# Altium footprint library ERNI THD.PcbLib: 27 footprints (part 1 of 3)
Each footprint in its own frame and in the unit in brackets; x right, y up, seen from the top. Pads: shape width x height; smd on the part's side, far side on the other; paste and mask are expansions set on the pad; w line width, h text height; cw(c..) or ccw(c..) is an arc to the next point about the centre after c.
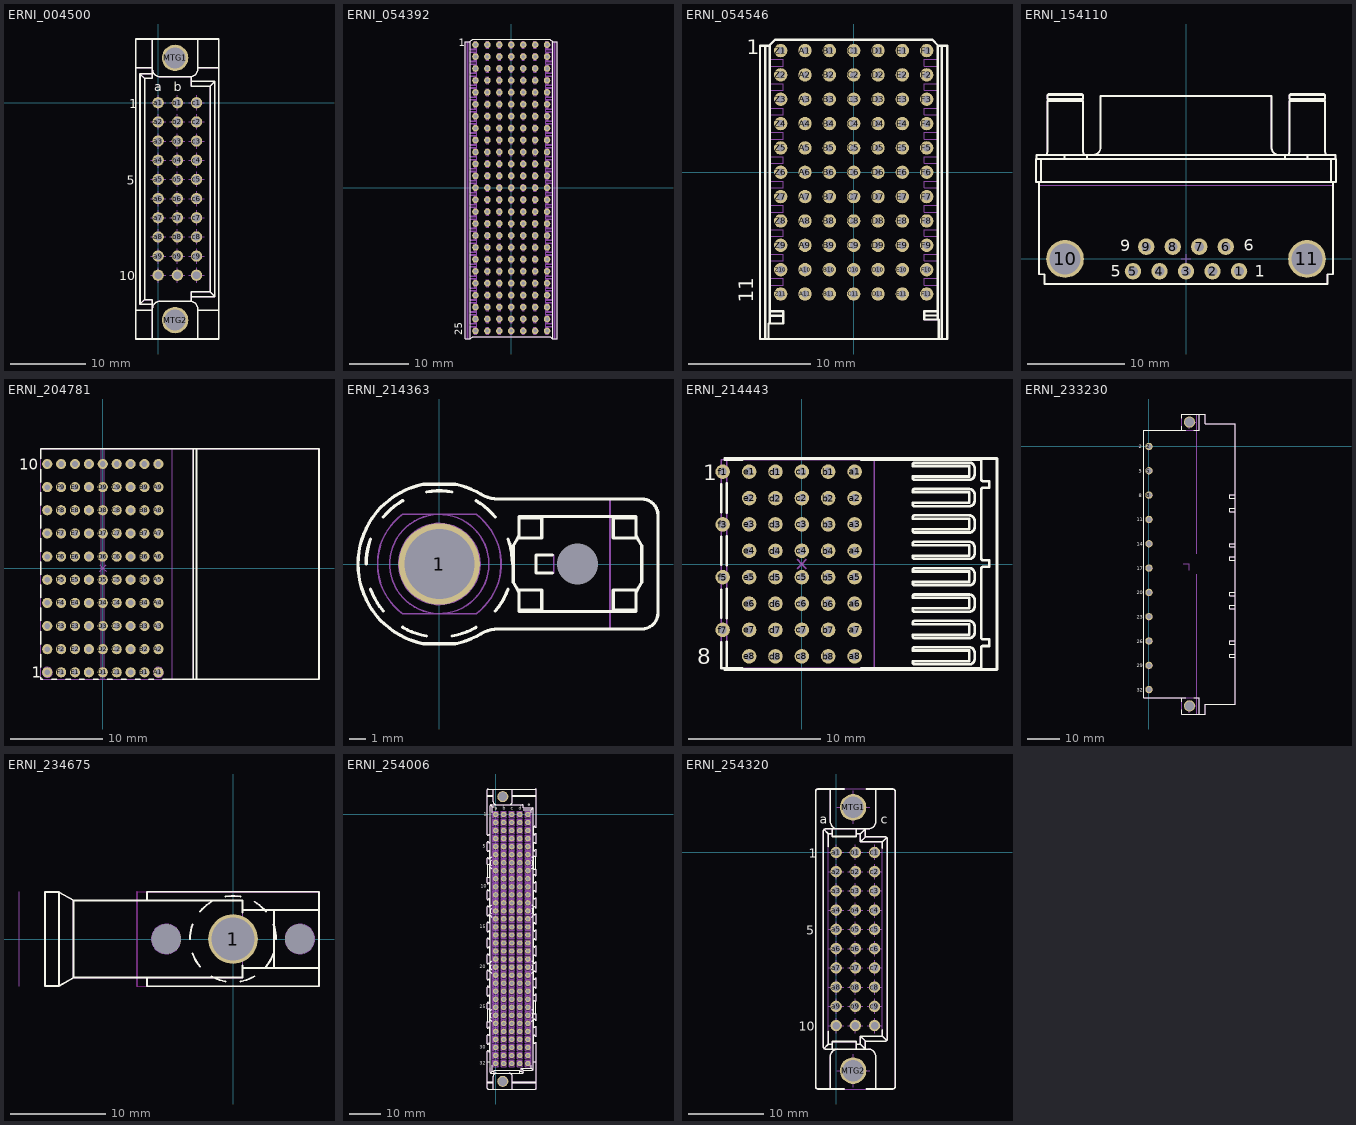
[diagram p0: the footprints below, top view; thin cyan lines are the x and y axes]

## ERNI_004500 [mm] "Connector; DIN 41612, Type R/3, Thru-Hole; Rows a+b+c, 30 Male Contacts"
height 11.5
pads (32):
  round 1.5 hole 1: a1(0,0) a2(0,-2.54) a3(0,-5.08) a4(0,-7.62) a5(0,-10.16) a6(0,-12.7) a7(0,-15.24) a8(0,-17.78) a9(0,-20.32) a10(0,-22.86) b1(2.54,0) b2(2.54,-2.54) b3(2.54,-5.08) b4(2.54,-7.62) b5(2.54,-10.16) b6(2.54,-12.7) b7(2.54,-15.24) b8(2.54,-17.78) b9(2.54,-20.32) b10(2.54,-22.86) c1(5.08,0) c2(5.08,-2.54) c3(5.08,-5.08) c4(5.08,-7.62) c5(5.08,-10.16) c6(5.08,-12.7) c7(5.08,-15.24) c8(5.08,-17.78) c9(5.08,-20.32) c10(5.08,-22.86)
  round 3.5 / inner round 3.5 / far side round 5.1 hole 2.8: MTG1(2.24,5.95) MTG2(2.24,-28.81)
Top Overlay:
  lines w0.2: -2.96,-27.479 -0.76,-27.479 ; -2.96,4.619 -0.76,4.619 ; -0.76,-31.309 -0.76,-27.479 ; -0.76,-26.679 -2.41,-26.679 ; -0.76,3.819 -2.41,3.819 ; -0.76,8.449 -0.76,4.619 ; 4.39,-26.314 4.39,-25.079 6.89,-25.079 ; 4.39,-25.679 4.99,-25.679 7.49,-25.679 ; 4.39,2.819 4.99,2.819 7.49,2.819 ; 4.39,3.454 4.39,2.219 6.89,2.219 ; 5.24,-31.309 5.24,-27.309 ccw(c4.24,-27.309) 4.24,-26.309 0.24,-26.309 ccw(c0.24,-27.309) -0.76,-27.309 ; 5.24,-27.479 8.04,-27.479 ; 5.24,4.619 8.04,4.619 ; 5.24,8.449 5.24,4.449 cw(c4.24,4.449) 4.24,3.449 0.24,3.449 cw(c0.24,4.449) -0.76,4.449 ; -2.41,-26.679 -1.81,-26.079 ; -2.41,-26.679 -2.41,3.819 ; -2.41,3.819 -1.81,3.219 ; -1.81,-26.079 -0.76,-26.079 -0.76,-27.309 ; -1.81,-26.079 -1.81,3.219 ; -1.81,3.219 -0.76,3.219 -0.76,4.449 ; -0.76,-27.479 -0.76,-27.309 ; -0.76,4.449 -0.76,4.619 ; 6.89,-25.079 6.89,2.219 ; 6.89,-25.079 7.49,-25.679 ; 6.89,2.219 7.49,2.819 ; 7.49,-25.679 7.49,2.819 ; -2.96,-31.309 -2.96,8.449 8.04,8.449 8.04,-31.309 -2.96,-31.309
  text "b" at 2.032,1.524 h1.2
  text "a" at -0.508,1.524 h1.2
  text "5" at -4.174,-10.885 h1.2
  text "10" at -5.172,-23.535 h1.2
  text "1" at -3.839,-0.725 h1.2
Mechanical 8:
  lines w0.1: -1,-22.86 0,-22.86 ; -1,-20.32 0,-20.32 ; -1,-17.78 0,-17.78 ; -1,-15.24 0,-15.24 ; -1,-12.7 0,-12.7 ; -1,-10.16 0,-10.16 ; -1,-7.62 0,-7.62 ; -1,-5.08 0,-5.08 ; -1,-2.54 0,-2.54 ; -1,0 0,0 ; 0,-23.86 0,-22.86 ; 0,-21.86 0,-22.86 ; 0,-21.32 0,-20.32 ; 0,-19.32 0,-20.32 ; 0,-18.78 0,-17.78 ; 0,-16.78 0,-17.78 ; 0,-16.24 0,-15.24 ; 0,-14.24 0,-15.24 ; 0,-13.7 0,-12.7 ; 0,-11.7 0,-12.7 ; 0,-11.16 0,-10.16 ; 0,-9.16 0,-10.16 ; 0,-8.62 0,-7.62 ; 0,-6.62 0,-7.62 ; 0,-6.08 0,-5.08 ; 0,-4.08 0,-5.08 ; 0,-3.54 0,-2.54 ; 0,-1.54 0,-2.54 ; 0,-1 0,0 ; 0,1 0,0 ; 1,-22.86 0,-22.86 ; 1,-20.32 0,-20.32 ; 1,-17.78 0,-17.78 ; 1,-15.24 0,-15.24 ; 1,-12.7 0,-12.7 ; 1,-10.16 0,-10.16 ; 1,-7.62 0,-7.62 ; 1,-5.08 0,-5.08 ; 1,-2.54 0,-2.54 ; 1,0 0,0 ; 1.24,-28.81 2.24,-28.81 ; 1.24,5.95 2.24,5.95 ; 1.54,-22.86 2.54,-22.86 ; 1.54,-20.32 2.54,-20.32 ; 1.54,-17.78 2.54,-17.78 ; 1.54,-15.24 2.54,-15.24 ; 1.54,-12.7 2.54,-12.7 ; 1.54,-10.16 2.54,-10.16 ; 1.54,-7.62 2.54,-7.62 ; 1.54,-5.08 2.54,-5.08 ; 1.54,-2.54 2.54,-2.54 ; 1.54,0 2.54,0 ; 2.24,-29.81 2.24,-28.81 ; 2.24,-27.81 2.24,-28.81 ; 2.24,4.95 2.24,5.95 ; 2.24,6.95 2.24,5.95 ; 2.54,-23.86 2.54,-22.86 ; 2.54,-21.86 2.54,-22.86 ; 2.54,-21.32 2.54,-20.32 ; 2.54,-19.32 2.54,-20.32 ; 2.54,-18.78 2.54,-17.78 ; 2.54,-16.78 2.54,-17.78 ; 2.54,-16.24 2.54,-15.24 ; 2.54,-14.24 2.54,-15.24 ; 2.54,-13.7 2.54,-12.7 ; 2.54,-11.7 2.54,-12.7 ; 2.54,-11.16 2.54,-10.16 ; 2.54,-9.16 2.54,-10.16 ; 2.54,-8.62 2.54,-7.62 ; 2.54,-6.62 2.54,-7.62 ; 2.54,-6.08 2.54,-5.08 ; 2.54,-4.08 2.54,-5.08 ; 2.54,-3.54 2.54,-2.54 ; 2.54,-1.54 2.54,-2.54 ; 2.54,-1 2.54,0 ; 2.54,1 2.54,0 ; 3.24,-28.81 2.24,-28.81 ; 3.24,5.95 2.24,5.95 ; 3.54,-22.86 2.54,-22.86 ; 3.54,-20.32 2.54,-20.32 ; 3.54,-17.78 2.54,-17.78 ; 3.54,-15.24 2.54,-15.24 ; 3.54,-12.7 2.54,-12.7 ; 3.54,-10.16 2.54,-10.16 ; 3.54,-7.62 2.54,-7.62 ; 3.54,-5.08 2.54,-5.08 ; 3.54,-2.54 2.54,-2.54 ; 3.54,0 2.54,0 ; 4.08,-22.86 5.08,-22.86 ; 4.08,-20.32 5.08,-20.32 ; 4.08,-17.78 5.08,-17.78 ; 4.08,-15.24 5.08,-15.24 ; 4.08,-12.7 5.08,-12.7 ; 4.08,-10.16 5.08,-10.16 ; 4.08,-7.64 5.08,-7.64 ; 4.08,-5.08 5.08,-5.08 ; 4.08,-2.54 5.08,-2.54 ; 4.08,0 5.08,0 ; 5.08,-23.86 5.08,-22.86 ; 5.08,-21.86 5.08,-22.86 ; 5.08,-21.32 5.08,-20.32 ; 5.08,-19.32 5.08,-20.32 ; 5.08,-18.78 5.08,-17.78 ; 5.08,-16.78 5.08,-17.78 ; 5.08,-16.24 5.08,-15.24 ; 5.08,-14.24 5.08,-15.24 ; 5.08,-13.7 5.08,-12.7 ; 5.08,-11.7 5.08,-12.7 ; 5.08,-11.16 5.08,-10.16 ; 5.08,-9.16 5.08,-10.16 ; 5.08,-8.64 5.08,-7.64 ; 5.08,-6.64 5.08,-7.64 ; 5.08,-6.08 5.08,-5.08 ; 5.08,-4.08 5.08,-5.08 ; 5.08,-3.54 5.08,-2.54 ; 5.08,-1.54 5.08,-2.54 ; 5.08,-1 5.08,0 ; 5.08,1 5.08,0 ; 6.08,-22.86 5.08,-22.86 ; 6.08,-20.32 5.08,-20.32 ; 6.08,-17.78 5.08,-17.78 ; 6.08,-15.24 5.08,-15.24 ; 6.08,-12.7 5.08,-12.7 ; 6.08,-10.16 5.08,-10.16 ; 6.08,-7.64 5.08,-7.64 ; 6.08,-5.08 5.08,-5.08 ; 6.08,-2.54 5.08,-2.54 ; 6.08,0 5.08,0
Mechanical 14:
  circle w0.1: c2.24,5.949 r1.4
  circle w0.1: c2.24,-28.809 r1.4
  lines w0.1: -2.96,-27.479 -0.76,-27.479 ; -2.96,4.619 -0.76,4.619 ; -0.76,-31.309 -0.76,-27.479 ; -0.76,-26.679 -2.41,-26.679 ; -0.76,3.819 -2.41,3.819 ; -0.76,8.449 -0.76,4.619 ; 4.39,-26.314 4.39,-25.079 6.89,-25.079 ; 4.39,-25.679 4.99,-25.679 7.49,-25.679 ; 4.39,2.819 4.99,2.819 7.49,2.819 ; 4.39,3.454 4.39,2.219 6.89,2.219 ; 5.24,-31.309 5.24,-27.309 ccw(c4.24,-27.309) 4.24,-26.309 0.24,-26.309 ccw(c0.24,-27.309) -0.76,-27.309 ; 5.24,-27.479 8.04,-27.479 ; 5.24,4.619 8.04,4.619 ; 5.24,8.449 5.24,4.449 cw(c4.24,4.449) 4.24,3.449 0.24,3.449 cw(c0.24,4.449) -0.76,4.449 ; -2.41,-26.679 -1.81,-26.079 ; -2.41,-26.679 -2.41,3.819 ; -2.41,3.819 -1.81,3.219 ; -1.81,-26.079 -0.76,-26.079 -0.76,-27.309 ; -1.81,-26.079 -1.81,3.219 ; -1.81,3.219 -0.76,3.219 -0.76,4.449 ; -0.76,-27.479 -0.76,-27.309 ; -0.76,4.449 -0.76,4.619 ; 6.89,-25.079 6.89,2.219 ; 6.89,-25.079 7.49,-25.679 ; 6.89,2.219 7.49,2.819 ; 7.49,-25.679 7.49,2.819 ; -2.96,-31.309 -2.96,8.449 8.04,8.449 8.04,-31.309 -2.96,-31.309
  text "b" at 2.032,1.524 h1.2
  text "a" at -0.508,1.524 h1.2
  text "10" at -5.172,-23.535 h1.2
  text "1" at -3.839,-0.725 h1.2
  text "5" at -4.174,-10.885 h1.2
3D body "ERNI_004500.stp": height 11.6, standoff -4.5, extent -2.96,-31.308 8.04,8.449

## ERNI_054392 [mm] "125 Signal Contact in 5 Rows + 50 Ground Shield in 2 Rows, (175 Contacts in 7 Rows z,a,b,c,d,e,f of 25 positions), Pitch 2 mm,  Press-Fit, Vertical Ermet Hard Metric Male Connector"
height 13.45
pads (175):
  round 1.1 hole 0.6: A1(-4,24) A2(-4,22) A3(-4,20) A4(-4,18) A5(-4,16) A6(-4,14) A7(-4,12) A8(-4,10) A9(-4,8) A10(-4,6) A11(-4,4) A12(-4,2) A13(-4,0) A14(-4,-2) A15(-4,-4) A16(-4,-6) A17(-4,-8) A18(-4,-10) A19(-4,-12) A20(-4,-14) A21(-4,-16) A22(-4,-18) A23(-4,-20) A24(-4,-22) A25(-4,-24) B1(-2,24) B2(-2,22) B3(-2,20) B4(-2,18) B5(-2,16) B6(-2,14) B7(-2,12) B8(-2,10) B9(-2,8) B10(-2,6) B11(-2,4) B12(-2,2) B13(-2,0) B14(-2,-2) B15(-2,-4) B16(-2,-6) B17(-2,-8) B18(-2,-10) B19(-2,-12) B20(-2,-14) B21(-2,-16) B22(-2,-18) B23(-2,-20) B24(-2,-22) B25(-2,-24) C1(0,24) C2(0,22) C3(0,20) C4(0,18) C5(0,16) C6(0,14) C7(0,12) C8(0,10) C9(0,8) C10(0,6) C11(0,4) C12(0,2) C13(0,0) C14(0,-2) C15(0,-4) C16(0,-6) C17(0,-8) C18(0,-10) C19(0,-12) C20(0,-14) C21(0,-16) C22(0,-18) C23(0,-20) C24(0,-22) C25(0,-24) D1(2,24) D2(2,22) D3(2,20) D4(2,18) D5(2,16) D6(2,14) D7(2,12) D8(2,10) D9(2,8) D10(2,6) D11(2,4) D12(2,2) D13(2,0) D14(2,-2) D15(2,-4) D16(2,-6) D17(2,-8) D18(2,-10) D19(2,-12) D20(2,-14) D21(2,-16) D22(2,-18) D23(2,-20) D24(2,-22) D25(2,-24) E1(4,24) E2(4,22) E3(4,20) E4(4,18) E5(4,16) E6(4,14) E7(4,12) E8(4,10) E9(4,8) E10(4,6) E11(4,4) E12(4,2) E13(4,0) E14(4,-2) E15(4,-4) E16(4,-6) E17(4,-8) E18(4,-10) E19(4,-12) E20(4,-14) E21(4,-16) E22(4,-18) E23(4,-20) E24(4,-22) E25(4,-24) F1(6,24) F2(6,22) F3(6,20) F4(6,18) F5(6,16) F6(6,14) F7(6,12) F8(6,10) F9(6,8) F10(6,6) F11(6,4) F12(6,2) F13(6,0) F14(6,-2) F15(6,-4) F16(6,-6) F17(6,-8) F18(6,-10) F19(6,-12) F20(6,-14) F21(6,-16) F22(6,-18) F23(6,-20) F24(6,-22) F25(6,-24) Z1(-6,24) Z2(-6,22) Z3(-6,20) Z4(-6,18) Z5(-6,16) Z6(-6,14) Z7(-6,12) Z8(-6,10) Z9(-6,8) Z10(-6,6) Z11(-6,4) Z12(-6,2) Z13(-6,0) Z14(-6,-2) Z15(-6,-4) Z16(-6,-6) Z17(-6,-8) Z18(-6,-10) Z19(-6,-12) Z20(-6,-14) Z21(-6,-16) Z22(-6,-18) Z23(-6,-20) Z24(-6,-22) Z25(-6,-24)
Top Overlay:
  lines w0.2: -6.9,24.5 -6.9,-25.35 ; 6.9,24.5 6.9,-25.35 ; 7.7,3 7.7,24.45 ; -6.9,-25.35 -6.5,-24.95 6.5,-24.95 6.9,-25.35 ; -6.9,-25.35 -7.7,-25.35 -7.7,24.45 -6.95,24.45 -6.45,24.95 6.45,24.95 6.95,24.45 7.7,24.45 ; 6.9,-25.35 7.7,-25.35 7.7,24.45
  text "25" at -8.25,-24.725 h1.2
  text "1" at -8.8,23.7 h1.2
Mechanical 8:
  lines w0.1: -6.5,-24 -6,-24 ; -6.5,-22 -6,-22 ; -6.5,22 -6,22 ; -6.5,24 -6,24 ; -6,-24.5 -6,-24 ; -6,-23.5 -6,-24 ; -6,-22.5 -6,-22 ; -6,-21.5 -6,-22 ; -6,21.5 -6,22 ; -6,22.5 -6,22 ; -6,23.5 -6,24 ; -6,24.5 -6,24 ; -5.5,-24 -6,-24 ; -5.5,-22 -6,-22 ; -5.5,22 -6,22 ; -5.5,24 -6,24 ; -4.5,-24 -4,-24 ; -4.5,-22 -4,-22 ; -4.5,22 -4,22 ; -4.5,24 -4,24 ; -4,-24.5 -4,-24 ; -4,-23.5 -4,-24 ; -4,-22.5 -4,-22 ; -4,-21.5 -4,-22 ; -4,21.5 -4,22 ; -4,22.5 -4,22 ; -4,23.5 -4,24 ; -4,24.5 -4,24 ; -3.5,-24 -4,-24 ; -3.5,-22 -4,-22 ; -3.5,22 -4,22 ; -3.5,24 -4,24 ; -2.5,-24 -2,-24 ; -2.5,-22 -2,-22 ; -2.5,22 -2,22 ; -2.5,24 -2,24 ; -2,-24.5 -2,-24 ; -2,-23.5 -2,-24 ; -2,-22.5 -2,-22 ; -2,-21.5 -2,-22 ; -2,21.5 -2,22 ; -2,22.5 -2,22 ; -2,23.5 -2,24 ; -2,24.5 -2,24 ; -1.5,-24 -2,-24 ; -1.5,-22 -2,-22 ; -1.5,22 -2,22 ; -1.5,24 -2,24 ; -0.5,-24 0,-24 ; -0.5,-22 0,-22 ; -0.5,0 0,0 ; -0.5,22 0,22 ; -0.5,24 0,24 ; 0,-24.5 0,-24 ; 0,-23.5 0,-24 ; 0,-22.5 0,-22 ; 0,-21.5 0,-22 ; 0,-0.5 0,0 ; 0,0.5 0,0 ; 0,21.5 0,22 ; 0,22.5 0,22 ; 0,23.5 0,24 ; 0,24.5 0,24 ; 0.5,-24 0,-24 ; 0.5,-22 0,-22 ; 0.5,0 0,0 ; 0.5,22 0,22 ; 0.5,24 0,24 ; 1.5,-24 2,-24 ; 1.5,-22 2,-22 ; 1.5,22 2,22 ; 1.5,24 2,24 ; 2,-24.5 2,-24 ; 2,-23.5 2,-24 ; 2,-22.5 2,-22 ; 2,-21.5 2,-22 ; 2,21.5 2,22 ; 2,22.5 2,22 ; 2,23.5 2,24 ; 2,24.5 2,24 ; 2.5,-24 2,-24 ; 2.5,-22 2,-22 ; 2.5,22 2,22 ; 2.5,24 2,24 ; 3.5,-24 4,-24 ; 3.5,-22 4,-22 ; 3.5,22 4,22 ; 3.5,24 4,24 ; 4,-24.5 4,-24 ; 4,-23.5 4,-24 ; 4,-22.5 4,-22 ; 4,-21.5 4,-22 ; 4,21.5 4,22 ; 4,22.5 4,22 ; 4,23.5 4,24 ; 4,24.5 4,24 ; 4.5,-24 4,-24 ; 4.5,-22 4,-22 ; 4.5,22 4,22 ; 4.5,24 4,24 ; 5.5,-24 6,-24 ; 5.5,-22 6,-22 ; 5.5,22 6,22 ; 5.5,24 6,24 ; 6,-24.5 6,-24 ; 6,-23.5 6,-24 ; 6,-22.5 6,-22 ; 6,-21.5 6,-22 ; 6,21.5 6,22 ; 6,22.5 6,22 ; 6,23.5 6,24 ; 6,24.5 6,24 ; 6.5,-24 6,-24 ; 6.5,-22 6,-22 ; 6.5,22 6,22 ; 6.5,24 6,24
Mechanical 14:
  drawing of 1008 lines, arcs and shapes, not listed
  text "25" at -8.25,-24.725 h1.2
  text "a" at -4.5,25.425 h1.2
  text "z" at -6.525,25.45 h1.2
  text "b" at -2.527,25.345 h1.2
  text "c" at -0.479,25.345 h1.2
  text "d" at 1.552,25.345 h1.2
  text "e" at 3.525,25.37 h1.2
  text "f" at 5.521,25.327 h1.2
  text "1" at -8.8,23.7 h1.2
Drill Drawing:
  lines w0.1: -6.9,-24.95 6.9,-24.95 6.9,24.95 -6.9,24.95 -6.9,-24.95
  text "PRESS-FIT TECHNOLOGY diam. 0.6mm +/-0.05" at 8.25,-18.9 h1
3D body "ERNI_054392.stp": height 13.45, standoff -3.7, extent -7.7,-25.35 7.7,24.95

## ERNI_054546 [mm] "55 Signal Contact in 5 Rows + 22 Ground Shield in 2 Rows, (77 Contacts in 7 Rows z,a,b,c,d,e,f of 11 positions), Pitch 2 mm,  Press-Fit, Vertical Ermet Hard Metric Type C Male Connector"
height 13.45
pads (77):
  round 1.1 hole 0.6: A1(-4,10) A2(-4,8) A3(-4,6) A4(-4,4) A5(-4,2) A6(-4,0) A7(-4,-2) A8(-4,-4) A9(-4,-6) A10(-4,-8) A11(-4,-10) B1(-2,10) B2(-2,8) B3(-2,6) B4(-2,4) B5(-2,2) B6(-2,0) B7(-2,-2) B8(-2,-4) B9(-2,-6) B10(-2,-8) B11(-2,-10) C1(0,10) C2(0,8) C3(0,6) C4(0,4) C5(0,2) C6(0,0) C7(0,-2) C8(0,-4) C9(0,-6) C10(0,-8) C11(0,-10) D1(2,10) D2(2,8) D3(2,6) D4(2,4) D5(2,2) D6(2,0) D7(2,-2) D8(2,-4) D9(2,-6) D10(2,-8) D11(2,-10) E1(4,10) E2(4,8) E3(4,6) E4(4,4) E5(4,2) E6(4,0) E7(4,-2) E8(4,-4) E9(4,-6) E10(4,-8) E11(4,-10) F1(6,10) F2(6,8) F3(6,6) F4(6,4) F5(6,2) F6(6,0) F7(6,-2) F8(6,-4) F9(6,-6) F10(6,-8) F11(6,-10) Z1(-6,10) Z2(-6,8) Z3(-6,6) Z4(-6,4) Z5(-6,2) Z6(-6,0) Z7(-6,-2) Z8(-6,-4) Z9(-6,-6) Z10(-6,-8) Z11(-6,-10)
Top Overlay:
  lines w0.2: -7.25,-13.7 -7.25,10.398 ; -7,-13.7 -7,-12.425 -5.8,-12.425 -5.8,-11.425 -6.9,-11.425 ; -6.95,10.398 -6.45,10.898 6.45,10.898 6.95,10.398 ; -6.9,-12.425 -6.9,10.398 -7.7,10.398 -7.7,-13.7 7.7,-13.7 7.7,10.398 6.9,10.398 6.9,-12.1 ; -6.9,-11.775 -5.8,-11.775 ; 5.8,-11.763 6.9,-11.775 ; 6.9,-11.425 5.8,-11.425 5.8,-12.1 7,-12.1 7,-13.7 ; 7.25,-13.7 7.25,10.398
  text "1" at -8.8,9.7 h1.2
  text "11" at -8.25,-10.725 h1.2
Mechanical 8:
  lines w0.1: -6.5,-10 -6,-10 ; -6.5,-8 -6,-8 ; -6.5,8 -6,8 ; -6.5,10 -6,10 ; -6,-10.5 -6,-10 ; -6,-9.5 -6,-10 ; -6,-8.5 -6,-8 ; -6,-7.5 -6,-8 ; -6,7.5 -6,8 ; -6,8.5 -6,8 ; -6,9.5 -6,10 ; -6,10.5 -6,10 ; -5.5,-10 -6,-10 ; -5.5,-8 -6,-8 ; -5.5,8 -6,8 ; -5.5,10 -6,10 ; -4.5,-10 -4,-10 ; -4.5,-8 -4,-8 ; -4.5,8 -4,8 ; -4.5,10 -4,10 ; -4,-10.5 -4,-10 ; -4,-9.5 -4,-10 ; -4,-8.5 -4,-8 ; -4,-7.5 -4,-8 ; -4,7.5 -4,8 ; -4,8.5 -4,8 ; -4,9.5 -4,10 ; -4,10.5 -4,10 ; -3.5,-10 -4,-10 ; -3.5,-8 -4,-8 ; -3.5,8 -4,8 ; -3.5,10 -4,10 ; -2.5,-10 -2,-10 ; -2.5,-8 -2,-8 ; -2.5,8 -2,8 ; -2.5,10 -2,10 ; -2,-10.5 -2,-10 ; -2,-9.5 -2,-10 ; -2,-8.5 -2,-8 ; -2,-7.5 -2,-8 ; -2,7.5 -2,8 ; -2,8.5 -2,8 ; -2,9.5 -2,10 ; -2,10.5 -2,10 ; -1.5,-10 -2,-10 ; -1.5,-8 -2,-8 ; -1.5,8 -2,8 ; -1.5,10 -2,10 ; -0.5,-10 0,-10 ; -0.5,-8 0,-8 ; -0.5,0 0,0 ; -0.5,8 0,8 ; -0.5,10 0,10 ; 0,-10.5 0,-10 ; 0,-9.5 0,-10 ; 0,-8.5 0,-8 ; 0,-7.5 0,-8 ; 0,-0.5 0,0 ; 0,0.5 0,0 ; 0,7.5 0,8 ; 0,8.5 0,8 ; 0,9.5 0,10 ; 0,10.5 0,10 ; 0.5,-10 0,-10 ; 0.5,-8 0,-8 ; 0.5,0 0,0 ; 0.5,8 0,8 ; 0.5,10 0,10 ; 1.5,-10 2,-10 ; 1.5,-8 2,-8 ; 1.5,8 2,8 ; 1.5,10 2,10 ; 2,-10.5 2,-10 ; 2,-9.5 2,-10 ; 2,-8.5 2,-8 ; 2,-7.5 2,-8 ; 2,7.5 2,8 ; 2,8.5 2,8 ; 2,9.5 2,10 ; 2,10.5 2,10 ; 2.5,-10 2,-10 ; 2.5,-8 2,-8 ; 2.5,8 2,8 ; 2.5,10 2,10 ; 3.5,-10 4,-10 ; 3.5,-8 4,-8 ; 3.5,8 4,8 ; 3.5,10 4,10 ; 4,-10.5 4,-10 ; 4,-9.5 4,-10 ; 4,-8.5 4,-8 ; 4,-7.5 4,-8 ; 4,7.5 4,8 ; 4,8.5 4,8 ; 4,9.5 4,10 ; 4,10.5 4,10 ; 4.5,-10 4,-10 ; 4.5,-8 4,-8 ; 4.5,8 4,8 ; 4.5,10 4,10 ; 5.5,-10 6,-10 ; 5.5,-8 6,-8 ; 5.5,8 6,8 ; 5.5,10 6,10 ; 6,-10.5 6,-10 ; 6,-9.5 6,-10 ; 6,-8.5 6,-8 ; 6,-7.5 6,-8 ; 6,7.5 6,8 ; 6,8.5 6,8 ; 6,9.5 6,10 ; 6,10.5 6,10 ; 6.5,-10 6,-10 ; 6.5,-8 6,-8 ; 6.5,8 6,8 ; 6.5,10 6,10
Mechanical 14:
  drawing of 390 lines, arcs and shapes, not listed
  text "1" at -8.8,9.7 h1.2
  text "f" at 5.6,11.374 h1.2
  text "e" at 3.5,11.354 h1.2
  text "d" at 1.6,11.374 h1.2
  text "c" at -0.4,11.374 h1.2
  text "b" at -2.4,11.374 h1.2
  text "a" at -4.4,11.374 h1.2
  text "z" at -6.4,11.374 h1.2
  text "11" at -8.25,-10.725 h1.2
Drill Drawing:
  lines w0.1: -6.9,-11 6.9,-11 6.9,10.95 -6.9,10.95 -6.9,-11
  text "PRESS-FIT TECHNOLOGY" at 8.45,-9.95 h1
  text "diam. 0.6mm +/-0.05" at 10.1,-9.775 h1
3D body "ERNI_054546.stp": height 13.45, standoff -3.3, extent -7.7,-13.7 7.7,10.898

## ERNI_154110 [mm] "Right Angle 9 Male Contacts D-SUB Connector With Threaded Bolt 4-40 UNC and Clip with Assembly Force"
height 7.5
pads (11):
  round 1.7 hole 1: 1(5.48,-1.27) 2(2.74,-1.27) 3(0,-1.27) 4(-2.74,-1.27) 5(-5.48,-1.27) 6(4.11,1.27) 7(1.37,1.27) 8(-1.37,1.27) 9(-4.11,1.27)
  round 3.9 hole 3.2: 10(-12.5,0) 11(12.5,0)
Top Overlay:
  lines w0.2: -15.44,10.339 -15.44,10.739 15.44,10.739 15.44,10.339 ; -15.2,7.939 -15.2,-1.581 -14.6,-1.581 -14.6,-2.581 14.6,-2.581 14.6,-1.581 15.2,-1.581 15.2,7.939 ; -15,10.339 -15,7.939 ; -14.369,10.739 -14.325,11.239 -14.325,16.339 ; -12.55,10.339 -12.55,10.739 ; -10.582,10.739 -10.625,11.239 -10.625,16.339 ; -10.25,10.339 -10.25,10.739 ; -9.625,10.739 ccw(c-9.625,11.539) -8.825,11.539 -8.825,16.839 8.825,16.839 8.825,11.539 ccw(c9.625,11.539) 9.625,10.739 ; 10.25,10.339 10.25,10.739 ; 10.632,10.739 10.675,11.239 10.675,16.339 ; 12.55,10.339 12.55,10.739 ; 14.419,10.739 14.375,11.239 14.375,16.339 ; 15,7.939 15,10.339 ; -15,7.939 15.5,7.939 15.5,10.339 -15.5,10.339 -15.5,7.939 -15,7.939 ; -14.325,16.339 ccw(c-14.325,16.439) -14.325,16.539 ; -14.325,16.339 -10.625,16.339 ; -14.325,16.539 -10.625,16.539 ; -14.325,16.539 -14.325,16.939 ; -14.325,16.939 -10.625,16.939 ; -14.325,16.939 -14.225,17.039 -10.725,17.039 -10.625,16.939 ; -10.625,16.339 cw(c-10.625,16.439) -10.625,16.539 ; -10.625,16.539 -10.625,16.939 ; 10.675,16.339 ccw(c10.675,16.439) 10.675,16.539 ; 10.675,16.339 14.375,16.339 ; 10.675,16.539 14.375,16.539 ; 10.675,16.539 10.675,16.939 ; 10.675,16.939 14.375,16.939 ; 10.675,16.939 10.775,17.039 14.275,17.039 14.375,16.939 ; 14.375,16.339 cw(c14.375,16.439) 14.375,16.539 ; 14.375,16.539 14.375,16.939
  text "1" at 7.081,-1.832 h1.2
  text "6" at 5.955,0.85 h1.2
  text "5" at -7.797,-1.857 h1.2
  text "9" at -6.812,0.8 h1.2
Mechanical 8:
  lines w0.1: -15.2,7.6 15.2,7.6 ; -13,0 -12.5,0 ; -12.5,-0.5 -12.5,0 ; -12.5,0.5 -12.5,0 ; -12,0 -12.5,0 ; -5.98,-1.27 -5.48,-1.27 ; -5.48,-1.77 -5.48,-1.27 ; -5.48,-0.77 -5.48,-1.27 ; -4.98,-1.27 -5.48,-1.27 ; -4.61,1.27 -4.11,1.27 ; -4.11,0.77 -4.11,1.27 ; -4.11,1.77 -4.11,1.27 ; -3.61,1.27 -4.11,1.27 ; -3.24,-1.27 -2.74,-1.27 ; -2.74,-1.77 -2.74,-1.27 ; -2.74,-0.77 -2.74,-1.27 ; -2.24,-1.27 -2.74,-1.27 ; -1.87,1.27 -1.37,1.27 ; -1.37,0.77 -1.37,1.27 ; -1.37,1.77 -1.37,1.27 ; -0.87,1.27 -1.37,1.27 ; -0.5,-1.27 0,-1.27 ; -0.5,0 0,0 ; 0,-1.77 0,-1.27 ; 0,-0.77 0,-1.27 ; 0,-0.5 0,0 ; 0,0.5 0,0 ; 0.5,-1.27 0,-1.27 ; 0.5,0 0,0 ; 0.87,1.27 1.37,1.27 ; 1.37,0.77 1.37,1.27 ; 1.37,1.77 1.37,1.27 ; 1.87,1.27 1.37,1.27 ; 2.24,-1.27 2.74,-1.27 ; 2.74,-1.77 2.74,-1.27 ; 2.74,-0.77 2.74,-1.27 ; 3.24,-1.27 2.74,-1.27 ; 3.61,1.27 4.11,1.27 ; 4.11,0.77 4.11,1.27 ; 4.11,1.77 4.11,1.27 ; 4.61,1.27 4.11,1.27 ; 4.98,-1.27 5.48,-1.27 ; 5.48,-1.77 5.48,-1.27 ; 5.48,-0.77 5.48,-1.27 ; 5.98,-1.27 5.48,-1.27 ; 12,0 12.5,0 ; 12.5,-0.5 12.5,0 ; 12.5,0.5 12.5,0 ; 13,0 12.5,0
Mechanical 14:
  lines w0.1: -15.44,10.339 -15.44,10.739 15.44,10.739 15.44,10.339 ; -15.2,7.939 -15.2,-1.581 -14.6,-1.581 -14.6,-2.581 14.6,-2.581 14.6,-1.581 15.2,-1.581 15.2,7.939 ; -15,10.339 -15,7.939 ; -14.369,10.739 -14.325,11.239 -14.325,16.339 ; -12.55,10.339 -12.55,10.739 ; -10.582,10.739 -10.625,11.239 -10.625,16.339 ; -10.25,10.339 -10.25,10.739 ; -9.625,10.739 ccw(c-9.625,11.539) -8.825,11.539 -8.825,16.839 8.825,16.839 8.825,11.539 ccw(c9.625,11.539) 9.625,10.739 ; 10.25,10.339 10.25,10.739 ; 10.632,10.739 10.675,11.239 10.675,16.339 ; 12.55,10.339 12.55,10.739 ; 14.419,10.739 14.375,11.239 14.375,16.339 ; 15,7.939 15,10.339 ; -15,7.939 15.5,7.939 15.5,10.339 -15.5,10.339 -15.5,7.939 -15,7.939 ; -14.325,16.339 ccw(c-14.325,16.439) -14.325,16.539 ; -14.325,16.339 -10.625,16.339 ; -14.325,16.539 -10.625,16.539 ; -14.325,16.539 -14.325,16.939 ; -14.325,16.939 -10.625,16.939 ; -14.325,16.939 -14.225,17.039 -10.725,17.039 -10.625,16.939 ; -10.625,16.339 cw(c-10.625,16.439) -10.625,16.539 ; -10.625,16.539 -10.625,16.939 ; 10.675,16.339 ccw(c10.675,16.439) 10.675,16.539 ; 10.675,16.339 14.375,16.339 ; 10.675,16.539 14.375,16.539 ; 10.675,16.539 10.675,16.939 ; 10.675,16.939 14.375,16.939 ; 10.675,16.939 10.775,17.039 14.275,17.039 14.375,16.939 ; 14.375,16.339 cw(c14.375,16.439) 14.375,16.539 ; 14.375,16.539 14.375,16.939
3D body "ERNI_154110.stp": height 9.9, standoff -3.01, extent -15.5,-2.581 15.5,17.039

## ERNI_204781 [mm] "90 Contacts (10x3 Pairs Signal Contacts + 3x10 Ground Contacts), Pitch 2.5mm, Press-Fit, Right Angle Ermet ZD High Speed Differential Hard Metric Male Connector"
height 18.98
pads (90):
  round 1.1 hole 0.6: A1(6,-11.25) A2(6,-8.75) A3(6,-6.25) A4(6,-3.75) A5(6,-1.25) A6(6,1.25) A7(6,3.75) A8(6,6.25) A9(6,8.75) A10(6,11.25) AB1(3,-11.25) AB2(3,-8.75) AB3(3,-6.25) AB4(3,-3.75) AB5(3,-1.25) AB6(3,1.25) AB7(3,3.75) AB8(3,6.25) AB9(3,8.75) AB10(3,11.25) B1(4.5,-11.25) B2(4.5,-8.75) B3(4.5,-6.25) B4(4.5,-3.75) B5(4.5,-1.25) B6(4.5,1.25) B7(4.5,3.75) B8(4.5,6.25) B9(4.5,8.75) B10(4.5,11.25) C1(1.5,-11.25) C2(1.5,-8.75) C3(1.5,-6.25) C4(1.5,-3.75) C5(1.5,-1.25) C6(1.5,1.25) C7(1.5,3.75) C8(1.5,6.25) C9(1.5,8.75) C10(1.5,11.25) CD1(-1.5,-11.25) CD2(-1.5,-8.75) CD3(-1.5,-6.25) CD4(-1.5,-3.75) CD5(-1.5,-1.25) CD6(-1.5,1.25) CD7(-1.5,3.75) CD8(-1.5,6.25) CD9(-1.5,8.75) CD10(-1.5,11.25) D1(0,-11.25) D2(0,-8.75) D3(0,-6.25) D4(0,-3.75) D5(0,-1.25) D6(0,1.25) D7(0,3.75) D8(0,6.25) D9(0,8.75) D10(0,11.25) E1(-3,-11.25) E2(-3,-8.75) E3(-3,-6.25) E4(-3,-3.75) E5(-3,-1.25) E6(-3,1.25) E7(-3,3.75) E8(-3,6.25) E9(-3,8.75) E10(-3,11.25) EF1(-6,-11.25) EF2(-6,-8.75) EF3(-6,-6.25) EF4(-6,-3.75) EF5(-6,-1.25) EF6(-6,1.25) EF7(-6,3.75) EF8(-6,6.25) EF9(-6,8.75) EF10(-6,11.25) F1(-4.5,-11.25) F2(-4.5,-8.75) F3(-4.5,-6.25) F4(-4.5,-3.75) F5(-4.5,-1.25) F6(-4.5,1.25) F7(-4.5,3.75) F8(-4.5,6.25) F9(-4.5,8.75) F10(-4.5,11.25)
Top Overlay:
  lines w0.2: -6.7,-11.816 -6.7,-12 -6.497,-12 ; -6.7,-10.684 -6.7,-9.316 ; -6.7,-8.184 -6.7,-6.816 ; -6.7,-5.684 -6.7,-4.316 ; -6.7,-3.184 -6.7,-1.816 ; -6.7,-0.684 -6.7,0.684 ; -6.7,1.816 -6.7,3.184 ; -6.7,4.316 -6.7,5.684 ; -6.7,6.816 -6.7,8.184 ; -6.7,9.316 -6.7,10.684 ; -6.7,11.816 -6.7,12.9 23.35,12.9 23.35,-12 6.497,-12 ; -5.503,-12 -4.997,-12 ; -4.003,-12 -3.497,-12 ; -2.503,-12 -1.997,-12 ; -1.003,-12 -0.497,-12 ; 0.497,-12 1.003,-12 ; 1.997,-12 2.503,-12 ; 3.497,-12 4.003,-12 ; 4.997,-12 5.503,-12 ; 9.775,-12 9.775,12.9 ; 10.13,-12 10.13,12.9
  text "1" at -7.65,-11.825 h1.2
  text "10" at -9.05,10.625 h1.2
Mechanical 8:
  drawing of 369 lines, arcs and shapes, not listed
  text "a" at 5.669,12.976 h1
  text "10" at 8.077,11.806 h1
  text "1" at 8.077,-11.044 h1
  text "ef" at -6.331,12.916 h1
  text "b" at 4.169,12.976 h1
  text "c" at 1.169,12.89 h1
  text "d" at -0.331,12.94 h1
  text "e" at -3.331,12.942 h1
  text "f" at -4.831,12.908 h1
  text "ab" at 2.669,12.999 h1
  text "cd" at -1.831,12.913 h1
  text "PCB EDGE" at 9.23,-4.975 h1.2
Mechanical 14:
  lines w0.1: -0.17,-12 -0.17,12.9 ; 0.13,-12 0.13,12.9 ; 9.775,-12 9.775,12.9 ; 10.13,-12 10.13,12.9 ; -6.7,-12 23.35,-12 23.35,12.9 -6.7,12.9 -6.7,-12
  text "1" at -7.65,-11.825 h1.2
  text "10" at -9.05,10.625 h1.2
Drill Drawing:
  lines w0.1: -6.55,-12.005 -6.55,11.995 ; -6.55,-12 6.815,-12 6.815,12 -6.55,12
  text "PRESS-FIT TECHNOLOGY" at 8.265,-8.75 h1
  text "diam. 0.6mm +/-0.05" at 9.875,-8.35 h1
3D body "ERNI_204781.stp": height 13.18, standoff -5.68, extent -6.7,-12 23.35,12.9
